# Altium footprint library HW_HOLLAND_NCDM_MONITOR_R1.PcbLib: 472 footprints (part 14 of 30)
Each footprint in its own frame and in the unit in brackets; x right, y up, seen from the top. Pads: shape width x height; smd on the part's side, far side on the other; paste and mask are expansions set on the pad; w line width, h text height; cw(c..) or ccw(c..) is an arc to the next point about the centre after c.
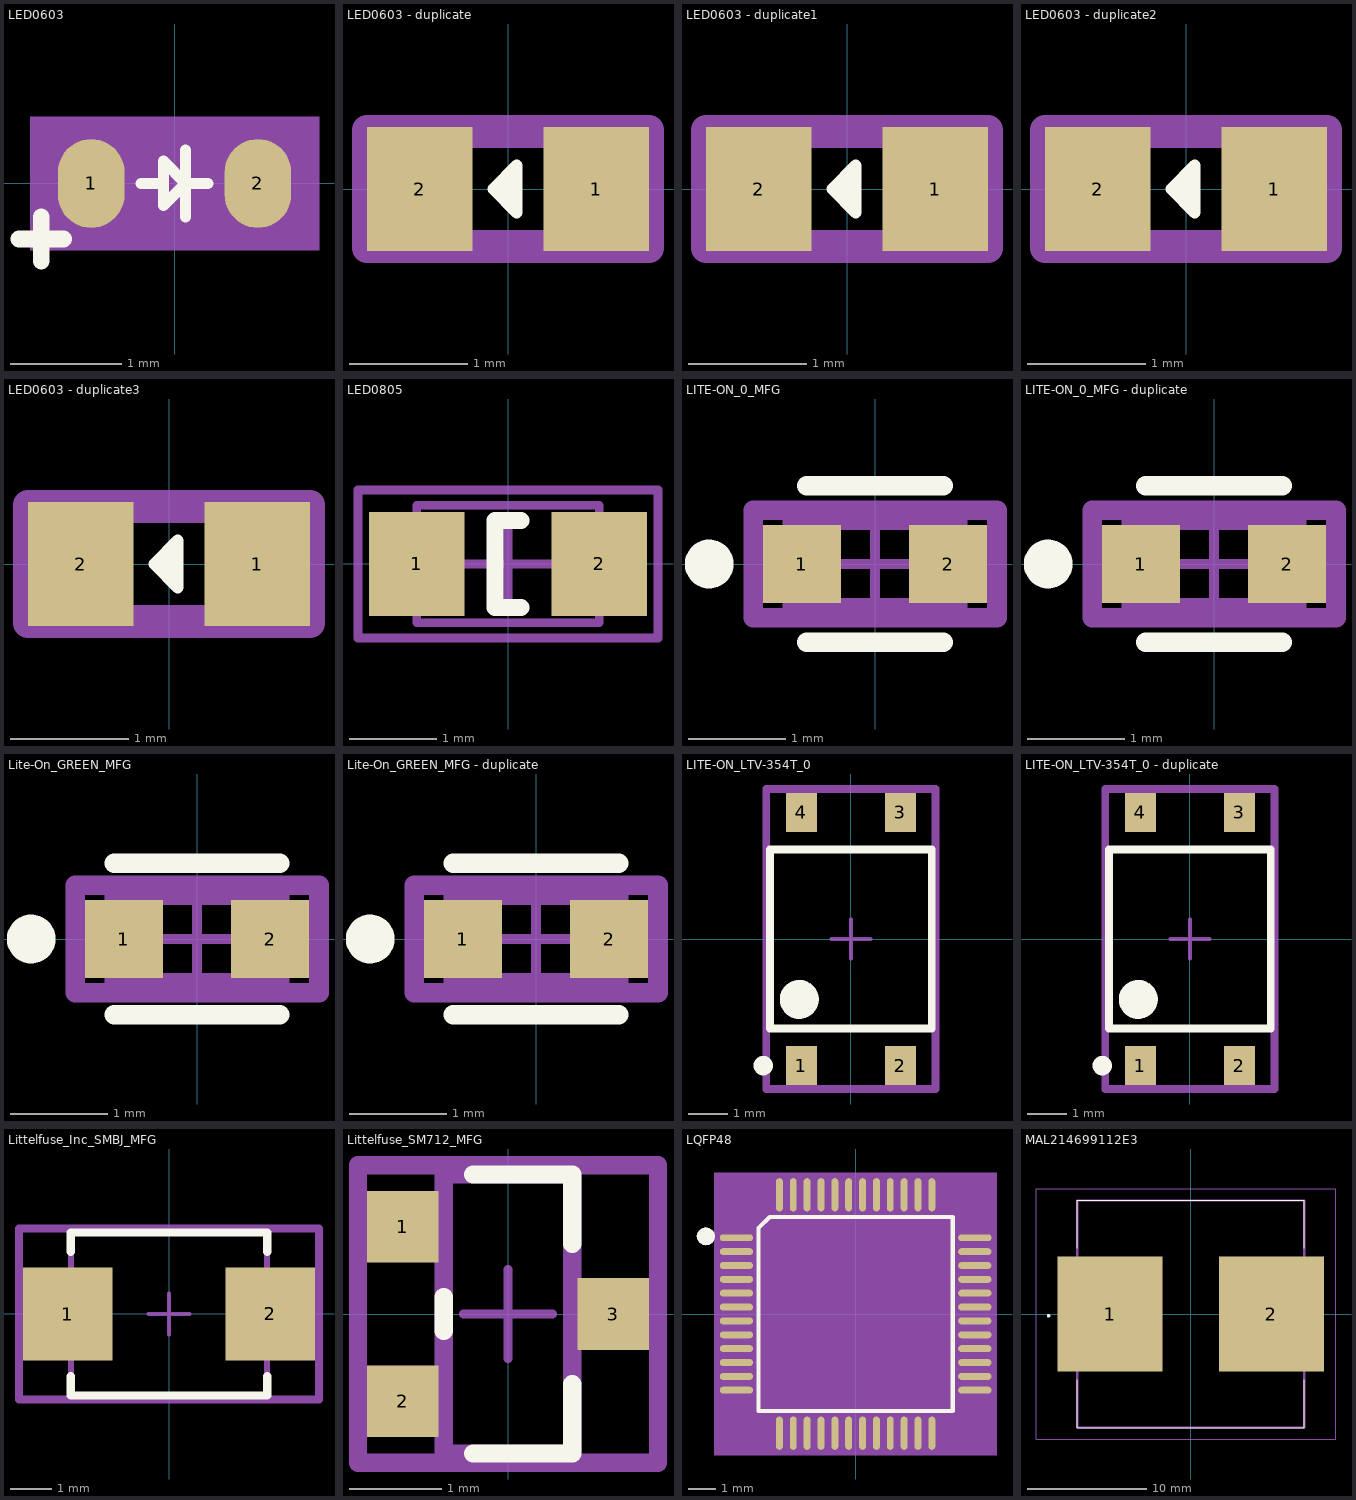
[diagram p13: the footprints below, top view; thin cyan lines are the x and y axes]

## LED0603 [mil]
pads (2):
  oval 23.62x31.5 smd: 1(-29.53,0) 2(29.53,0)
Top Overlay:
  lines w3.94: -11.81,0 -3.94,0 ; 3.94,-11.81 3.94,11.81 ; 11.81,0 3.94,0 ; 3.94,0 -3.94,-7.87 -3.94,7.87 3.94,0
  lines w6: -55.12,-19.68 -39.37,-19.68 ; -47.24,-27.56 -47.24,-11.81
Top Assembly:
  lines w1: -55.12,-19.68 -39.37,-19.68 ; -47.24,-27.56 -47.24,-11.81 ; -31.5,-15.75 31.5,-15.75 31.5,15.75 -31.5,15.75 -31.5,-15.75
  text ".Designator" at 37.51,8.33 h25
Top 3D Body:
  region: -51.18,23.62 51.18,23.62 51.18,-23.62 -51.18,-23.62
Mechanical 17:
  text "2" at 35.43,-42.34 h48
  text "1" at -23.62,-42.34 h48
3D body: height 150, standoff 0, extent -51.18,-23.62 51.18,23.62

## LED0603 - duplicate [mm]
height 3.5
pads (2):
  rect 0.9x1.05 smd: 1(0.75,0) 2(-0.75,0)
Top Overlay:
  lines w0.1: -0.025,-0.1 0.075,0 ; -0.025,0.1 0.075,0 ; -0.125,0 -0.125,0 ; -0.125,0 0.075,-0.2 0.075,0.2 -0.125,0 ; -0.125,0 0.075,0
Top 3D Body:
  lines w0.1: -0.8,-0.4 0.8,-0.4 0.8,0.4 -0.8,0.4 -0.8,-0.4
Top Designator:
  lines w0.254: -1.2,-0.5 1.2,-0.5 1.2,0.5 -1.2,0.5 -1.2,-0.5
3D body "STEP-WL-SMCW-0603-rev1.stp": height 0.7, standoff 0, extent -0.8,-0.4 0.8,0.4

## LED0603 - duplicate1 [mm]
height 3.5
pads (2):
  rect 0.9x1.05 smd: 1(0.75,0) 2(-0.75,0)
Top Overlay:
  lines w0.1: -0.025,-0.1 0.075,0 ; -0.025,0.1 0.075,0 ; -0.125,0 -0.125,0 ; -0.125,0 0.075,-0.2 0.075,0.2 -0.125,0 ; -0.125,0 0.075,0
Top 3D Body:
  lines w0.1: -0.8,-0.4 0.8,-0.4 0.8,0.4 -0.8,0.4 -0.8,-0.4
Top Designator:
  lines w0.254: -1.2,-0.5 1.2,-0.5 1.2,0.5 -1.2,0.5 -1.2,-0.5
3D body "STEP-WL-SMCW-0603-rev1.stp": height 0.7, standoff 0, extent -0.8,-0.4 0.8,0.4

## LED0603 - duplicate2 [mm]
pads (2):
  rect 0.9x1.05 smd: 1(0.75,0) 2(-0.75,0)
Top Overlay:
  lines w0.1: -0.025,-0.1 0.075,0 ; -0.025,0.1 0.075,0 ; -0.125,0 0.075,-0.2 0.075,0.2 -0.125,0 ; -0.125,0 0.075,0
Top 3D Body:
  lines w0.1: -0.8,-0.4 0.8,-0.4 0.8,0.4 -0.8,0.4 -0.8,-0.4
Top Designator:
  lines w0.254: -1.2,-0.5 1.2,-0.5 1.2,0.5 -1.2,0.5 -1.2,-0.5
  text ".Designator" at -2.812,-0.282 h1.25
3D body "STEP-WL-SMCW-0603-rev1.stp": height 0.7, standoff 0, extent -0.8,-0.4 0.8,0.4

## LED0603 - duplicate3 [mm]
height 0.52
pads (2):
  rect 0.9x1.05 smd: 1(0.75,0) 2(-0.75,0)
Top Overlay:
  lines w0.1: -0.025,-0.1 0.075,0 ; -0.025,0.1 0.075,0 ; -0.125,0 0.075,-0.2 0.075,0.2 -0.125,0 ; -0.125,0 0.075,0
Top 3D Body:
  lines w0.1: -0.8,-0.4 0.8,-0.4 0.8,0.4 -0.8,0.4 -0.8,-0.4
Top Designator:
  lines w0.254: -1.2,-0.5 1.2,-0.5 1.2,0.5 -1.2,0.5 -1.2,-0.5
  text ".Designator" at -2.539,-0.169 h0.51
3D body "STEP-WL-SMCW-0603-rev1.stp": height 0.7, standoff 0, extent -0.8,-0.4 0.8,0.4

## LED0805 [mm]
pads (2):
  rect 1.1x1.2 smd: 1(-1.05,0) 2(1.05,0)
Top Overlay:
  lines w0.2: 0.15,-0.5 -0.15,-0.5 -0.15,0.5 0.15,0.5
Mechanical 13:
  lines w0.1: -1.05,-0.675 1.05,-0.675 1.05,0.675 -1.05,0.675 -1.05,-0.675
Mechanical 15:
  lines w0.1: -0.5,0 0.5,0 ; 0,-0.5 0,0.5 ; -1.725,-0.85 1.725,-0.85 1.725,0.85 -1.725,0.85 -1.725,-0.85
3D body "WL-SMCW_0805_LED.stp": height 0.68, standoff -0.02, extent -1,-0.625 1,0.625

## LITE-ON_0_MFG [mm]
pads (2):
  rect 0.8x0.8 smd paste+0 mask+0: 1(-0.75,0) 2(0.75,0)
Top Overlay:
  circle w0.25: c-1.7,0 r0.125
  lines w0.2: -0.7,-0.8 0.7,-0.8 ; -0.7,0.8 0.7,0.8
Top Courtyard:
  lines w0.2: -1.25,-0.55 1.25,-0.55 1.25,0.55 -1.25,0.55 -1.25,-0.55
  text ".Designator" at 0,0 h1
Mechanical 12:
  lines w0.2: -0.85,-0.45 0.85,-0.45 0.85,0.45 -0.85,0.45 -0.85,-0.45
Mechanical 15:
  lines w0.1: -0.5,0 0.5,0 ; 0,-0.5 0,0.5
  lines w0.2: -1.25,-0.55 1.25,-0.55 1.25,0.55 -1.25,0.55 -1.25,-0.55
3D body "Diode_Lite-On_LTST-C191KRKT_eec.STEP": height 0.65, standoff 0, extent -0.8,-0.4 0.8,0.4

## LITE-ON_0_MFG - duplicate [mm]
pads (2):
  rect 0.8x0.8 smd paste+0 mask+0: 1(-0.75,0) 2(0.75,0)
Top Overlay:
  circle w0.25: c-1.7,0 r0.125
  lines w0.2: -0.7,-0.8 0.7,-0.8 ; -0.7,0.8 0.7,0.8
Top Courtyard:
  lines w0.2: -1.25,-0.55 1.25,-0.55 1.25,0.55 -1.25,0.55 -1.25,-0.55
  text ".Designator" at 0,0 h1
Mechanical 12:
  lines w0.2: -0.85,-0.45 0.85,-0.45 0.85,0.45 -0.85,0.45 -0.85,-0.45
Mechanical 15:
  lines w0.1: -0.5,0 0.5,0 ; 0,-0.5 0,0.5
  lines w0.2: -1.25,-0.55 1.25,-0.55 1.25,0.55 -1.25,0.55 -1.25,-0.55
3D body "Diode_Lite-On_LTST-C191KRKT_eec.STEP": height 0.65, standoff 0, extent -0.8,-0.4 0.8,0.4

## Lite-On_GREEN_MFG [mm]
pads (2):
  rect 0.8x0.8 smd paste+0 mask+0: 1(-0.75,0) 2(0.75,0)
Top Overlay:
  circle w0.25: c-1.7,0 r0.125
  lines w0.2: -0.85,-0.775 0.85,-0.775 ; -0.85,0.775 0.85,0.775
Top Courtyard:
  lines w0.2: -1.25,-0.55 1.25,-0.55 1.25,0.55 -1.25,0.55 -1.25,-0.55
  text ".Designator" at 0,0 h1
Mechanical 12:
  lines w0.2: -0.85,-0.45 0.85,-0.45 0.85,0.45 -0.85,0.45 -0.85,-0.45
Mechanical 15:
  lines w0.1: -0.5,0 0.5,0 ; 0,-0.5 0,0.5
  lines w0.2: -1.25,-0.55 1.25,-0.55 1.25,0.55 -1.25,0.55 -1.25,-0.55
3D body "Diode_Lite-On_LTST-C191KGKT_eec.STEP": height 0.25, standoff 0, extent -1.25,-0.55 1.25,0.55

## Lite-On_GREEN_MFG - duplicate [mm]
pads (2):
  rect 0.8x0.8 smd paste+0 mask+0: 1(-0.75,0) 2(0.75,0)
Top Overlay:
  circle w0.25: c-1.7,0 r0.125
  lines w0.2: -0.85,-0.775 0.85,-0.775 ; -0.85,0.775 0.85,0.775
Top Courtyard:
  lines w0.2: -1.25,-0.55 1.25,-0.55 1.25,0.55 -1.25,0.55 -1.25,-0.55
  text ".Designator" at 0,0 h1
Mechanical 12:
  lines w0.2: -0.85,-0.45 0.85,-0.45 0.85,0.45 -0.85,0.45 -0.85,-0.45
Mechanical 15:
  lines w0.1: -0.5,0 0.5,0 ; 0,-0.5 0,0.5
  lines w0.2: -1.25,-0.55 1.25,-0.55 1.25,0.55 -1.25,0.55 -1.25,-0.55
3D body "Diode_Lite-On_LTST-C191KGKT_eec.STEP": height 0.25, standoff 0, extent -1.25,-0.55 1.25,0.55

## LITE-ON_LTV-354T_0 [mm]
pads (4):
  rect 0.8x1 smd paste+0 mask+0: 1(-1.27,-3.25) 2(1.27,-3.25) 3(1.27,3.25) 4(-1.27,3.25)
Top Overlay:
  circle w0.5: c-1.325,-1.55 r0.25
  circle w0.25: c-2.25,-3.25 r0.125
  lines w0.2: -2.075,-2.3 -2.075,2.3 2.075,2.3 2.075,-2.3 -2.075,-2.3
Top Courtyard:
  lines w0.2: -2.175,-3.85 -2.175,3.85 2.175,3.85 2.175,-3.85 -2.175,-3.85
  text ".Designator" at 0,0 h1
Mechanical 12:
  lines w0.15: -2.075,-2.3 -2.075,2.3 2.075,2.3 2.075,-2.3 -2.075,-2.3
Mechanical 15:
  lines w0.1: -0.5,0 0.5,0 ; 0,-0.5 0,0.5
  lines w0.2: -2.175,-3.85 -2.175,3.85 2.175,3.85 2.175,-3.85 -2.175,-3.85
3D body "IC_Lite-On_LTV-354T_eec.STEP": height 2.4, standoff 0, extent -1.925,-3.375 1.925,3.375

## LITE-ON_LTV-354T_0 - duplicate [mm]
pads (4):
  rect 0.8x1 smd paste+0 mask+0: 1(-1.27,-3.25) 2(1.27,-3.25) 3(1.27,3.25) 4(-1.27,3.25)
Top Overlay:
  circle w0.5: c-1.325,-1.55 r0.25
  circle w0.25: c-2.25,-3.25 r0.125
  lines w0.2: -2.075,-2.3 -2.075,2.3 2.075,2.3 2.075,-2.3 -2.075,-2.3
Top Courtyard:
  lines w0.2: -2.175,-3.85 -2.175,3.85 2.175,3.85 2.175,-3.85 -2.175,-3.85
  text ".Designator" at 0,0 h1
Mechanical 12:
  lines w0.15: -2.075,-2.3 -2.075,2.3 2.075,2.3 2.075,-2.3 -2.075,-2.3
Mechanical 15:
  lines w0.1: -0.5,0 0.5,0 ; 0,-0.5 0,0.5
  lines w0.2: -2.175,-3.85 -2.175,3.85 2.175,3.85 2.175,-3.85 -2.175,-3.85
3D body "IC_Lite-On_LTV-354T_eec.STEP": height 2.4, standoff 0, extent -1.925,-3.375 1.925,3.375

## Littelfuse_Inc_SMBJ_MFG [mm]
pads (2):
  rect 2.16x2.26 smd paste+0 mask+0: 1(-2.45,0) 2(2.45,0)
Top Overlay:
  lines w0.2: -2.375,-1.505 -2.375,-1.97 2.375,-1.97 2.375,-1.505 ; -2.375,1.505 -2.375,1.97 2.375,1.97 2.375,1.505
Top Courtyard:
  lines w0.2: -3.63,-2.07 -3.63,2.07 3.63,2.07 3.63,-2.07 -3.63,-2.07
  text ".Designator" at 0,0 h1.25
Mechanical 12:
  lines w0.15: -2.375,-1.97 -2.375,1.97 2.375,1.97 2.375,-1.97 -2.375,-1.97
Mechanical 15:
  lines w0.1: -0.5,0 0.5,0 ; 0,-0.5 0,0.5
  lines w0.2: -3.63,-2.07 -3.63,2.07 3.63,2.07 3.63,-2.07 -3.63,-2.07
3D body "Diode_Littelfuse_Inc_SMBJ40CA_eec.STEP": height 0.25, standoff 0, extent -3.63,-2.07 3.63,2.07

## Littelfuse_SM712_MFG [mm]
pads (3):
  rect 0.78x0.78 smd paste+0 mask+0: 1(-1.145,0.95) 2(-1.145,-0.95) 3(1.145,0)
Top Overlay:
  lines w0.2: -0.7,-0.185 -0.7,0.185 ; -0.38,-1.52 0.7,-1.52 0.7,-0.765 ; -0.38,1.52 0.7,1.52 0.7,0.765
Top Courtyard:
  lines w0.2: -1.635,-1.62 -1.635,1.62 1.635,1.62 1.635,-1.62 -1.635,-1.62
  text ".Designator" at 0,0.046 h1.25
Mechanical 12:
  lines w0.2: -0.7,-1.52 -0.7,1.52 0.7,1.52 0.7,-1.52 -0.7,-1.52
Mechanical 15:
  lines w0.1: -0.486,0 0.486,0 ; 0,-0.486 0,0.486
  lines w0.2: -1.635,-1.62 -1.635,1.62 1.635,1.62 1.635,-1.62 -1.635,-1.62
3D body "SOT23-3.step": height 1.1, standoff 0, extent -1.25,-1.5 1.25,1.5

## LQFP48 [mm]
pads (48):
  oval 1.2x0.25 smd: 1(-4.3,2.75) 2(-4.3,2.25) 3(-4.3,1.749) 4(-4.3,1.249) 5(-4.3,0.751) 6(-4.3,0.251) 7(-4.3,-0.25) 8(-4.3,-0.75) 9(-4.3,-1.25) 10(-4.3,-1.751) 11(-4.3,-2.251) 12(-4.3,-2.749) 25(4.3,-2.749) 26(4.3,-2.251) 27(4.3,-1.751) 28(4.3,-1.25) 29(4.3,-0.75) 30(4.3,-0.25) 31(4.3,0.251) 32(4.3,0.751) 33(4.3,1.249) 34(4.3,1.749) 35(4.3,2.25) 36(4.3,2.75)
  oval 0.25x1.2 smd: 13(-2.749,-4.299) 14(-2.251,-4.299) 15(-1.751,-4.299) 16(-1.25,-4.299) 17(-0.75,-4.299) 18(-0.249,-4.299) 19(0.251,-4.299) 20(0.751,-4.299) 21(1.249,-4.299) 22(1.75,-4.299) 23(2.25,-4.299) 24(2.75,-4.299) 37(2.75,4.301) 38(2.25,4.301) 39(1.75,4.301) 40(1.249,4.301) 41(0.751,4.301) 42(0.251,4.301) 43(-0.249,4.301) 44(-0.75,4.301) 45(-1.25,4.301) 46(-1.751,4.301) 47(-2.251,4.301) 48(-2.749,4.301)
Top Overlay:
  dashed: -5.078,2.8 -5.102,2.923 -5.172,3.028 -5.277,3.098 -5.4,3.122 -5.523,3.098 -5.558,3.074 -5.628,3.028 -5.698,2.923 -5.722,2.8 -5.698,2.677 -5.628,2.572 -5.558,2.526 -5.523,2.502 -5.4,2.478 -5.277,2.502 -5.172,2.572 -5.102,2.677
  lines w0.152: -3.5,-3.5 -3.5,3.1 -3.1,3.5 3.5,3.5 3.5,-3.5 -3.5,-3.5
Top Assembly:
  dashed: -5.078,2.8 -5.102,2.923 -5.172,3.028 -5.277,3.098 -5.4,3.122 -5.523,3.098 -5.558,3.074 -5.628,3.028 -5.698,2.923 -5.722,2.8 -5.698,2.677 -5.628,2.572 -5.558,2.526 -5.523,2.502 -5.4,2.478 -5.277,2.502 -5.172,2.572 -5.102,2.677
  lines w0.025: -3.5,-3.5 -3.5,3.5 3.5,3.5 3.5,-3.5 -3.5,-3.5
  text ".Designator" at -0.953,-0.212 h0.64
Top 3D Body:
  region: -5.1,5.1 -5.1,-5.1 5.1,-5.1 5.1,5.1
Mechanical 17:
  text "30" at 4.3,-0.25 h4.06
  text "31" at 4.3,0.251 h4.06
  text "42" at -6.251,4.301 h4.06
  text "43" at -6.752,4.301 h4.06
  text "44" at -7.252,4.301 h4.06
  text "45" at -7.753,4.301 h4.06
  text "46" at -8.253,4.301 h4.06
  text "47" at -8.753,4.301 h4.06
  text "2" at -4.3,2.25 h4.06
  text "4" at -4.3,1.249 h4.06
  text "39" at -4.753,4.301 h4.06
  text "14" at -8.753,-4.299 h4.06
  text "15" at -8.253,-4.299 h4.06
  text "18" at -6.752,-4.299 h4.06
  text "17" at -7.252,-4.299 h4.06
  text "29" at 4.3,-0.75 h4.06
  text "26" at 4.3,-2.251 h4.06
  text "3" at -4.3,1.749 h4.06
  text "21" at -5.253,-4.299 h4.06
  text "11" at -4.3,-2.251 h4.06
  text "34" at 4.3,1.749 h4.06
  text "9" at -4.3,-1.25 h4.06
  text "35" at 4.3,2.25 h4.06
  text "48" at -9.251,4.301 h4.06
  text "20" at -5.751,-4.299 h4.06
  text "23" at -4.252,-4.299 h4.06
  text "12" at -4.3,-2.749 h4.06
  text "24" at -3.752,-4.299 h4.06
  text "38" at -4.252,4.301 h4.06
  text "28" at 4.3,-1.25 h4.06
  text "40" at -5.253,4.301 h4.06
  text "36" at 4.3,2.75 h4.06
  text "37" at -3.752,4.301 h4.06
  text "10" at -4.3,-1.751 h4.06
  text "16" at -7.753,-4.299 h4.06
  text "22" at -4.753,-4.299 h4.06
  text "6" at -4.3,0.251 h4.06
  text "8" at -4.3,-0.75 h4.06
  text "7" at -4.3,-0.25 h4.06
  text "5" at -4.3,0.751 h4.06
  text "25" at 4.3,-2.749 h4.06
  text "33" at 4.3,1.249 h4.06
  text "1" at -4.3,2.75 h4.06
  text "13" at -9.251,-4.299 h4.06
  text "41" at -5.751,4.301 h4.06
  text "19" at -6.251,-4.299 h4.06
  text "32" at 4.3,0.751 h4.06
  text "27" at 4.3,-1.751 h4.06
3D body: height 3.81, standoff 0, extent -5.1,-5.1 5.1,5.1

## MAL214699112E3 [mm]
pads (2):
  rect 8.8x9.6 smd: 1(-6.75,0) 2(6.75,0)
Top Overlay:
  lines w0.1: -9.5,-9.5 9.5,-9.5 ; -9.5,-9.5 9.5,-9.5 ; -9.5,-9.5 -9.5,-5.5 -9.5,-9.5 ; -9.5,9.5 -9.5,5.5 -9.5,9.5 ; -9.5,9.5 9.5,9.5 ; -9.5,9.5 9.5,9.5 ; 9.5,-9.5 9.5,-5.5 9.5,-9.5 ; 9.5,9.5 9.5,5.5 9.5,9.5
  lines w0.2: -11.9,-0.2 ccw(c-11.9,-0.15) -11.9,-0.1 ; -11.9,-0.2 cw(c-11.9,-0.15) -11.9,-0.1 ; -11.9,-0.2 ccw(c-11.9,-0.15) -11.9,-0.1
Mechanical 15:
  lines w0.2: -9.5,-9.5 9.5,-9.5 9.5,9.5 -9.5,9.5 -9.5,-9.5
Mechanical 20:
  lines w0.1: -12.95,-10.5 12.15,-10.5 12.15,10.5 -12.95,10.5 -12.95,-10.5
3D body "MAL214699909E3.stp": height 17.5, standoff 0, extent -10.754,-9.525 10.246,9.475